# Altium footprint library PcbLib1.PcbLib: 1016 footprints (part 37 of 64)
Each footprint in its own frame and in the unit in brackets; x right, y up, seen from the top. Pads: shape width x height; smd on the part's side, far side on the other; paste and mask are expansions set on the pad; w line width, h text height; cw(c..) or ccw(c..) is an arc to the next point about the centre after c.
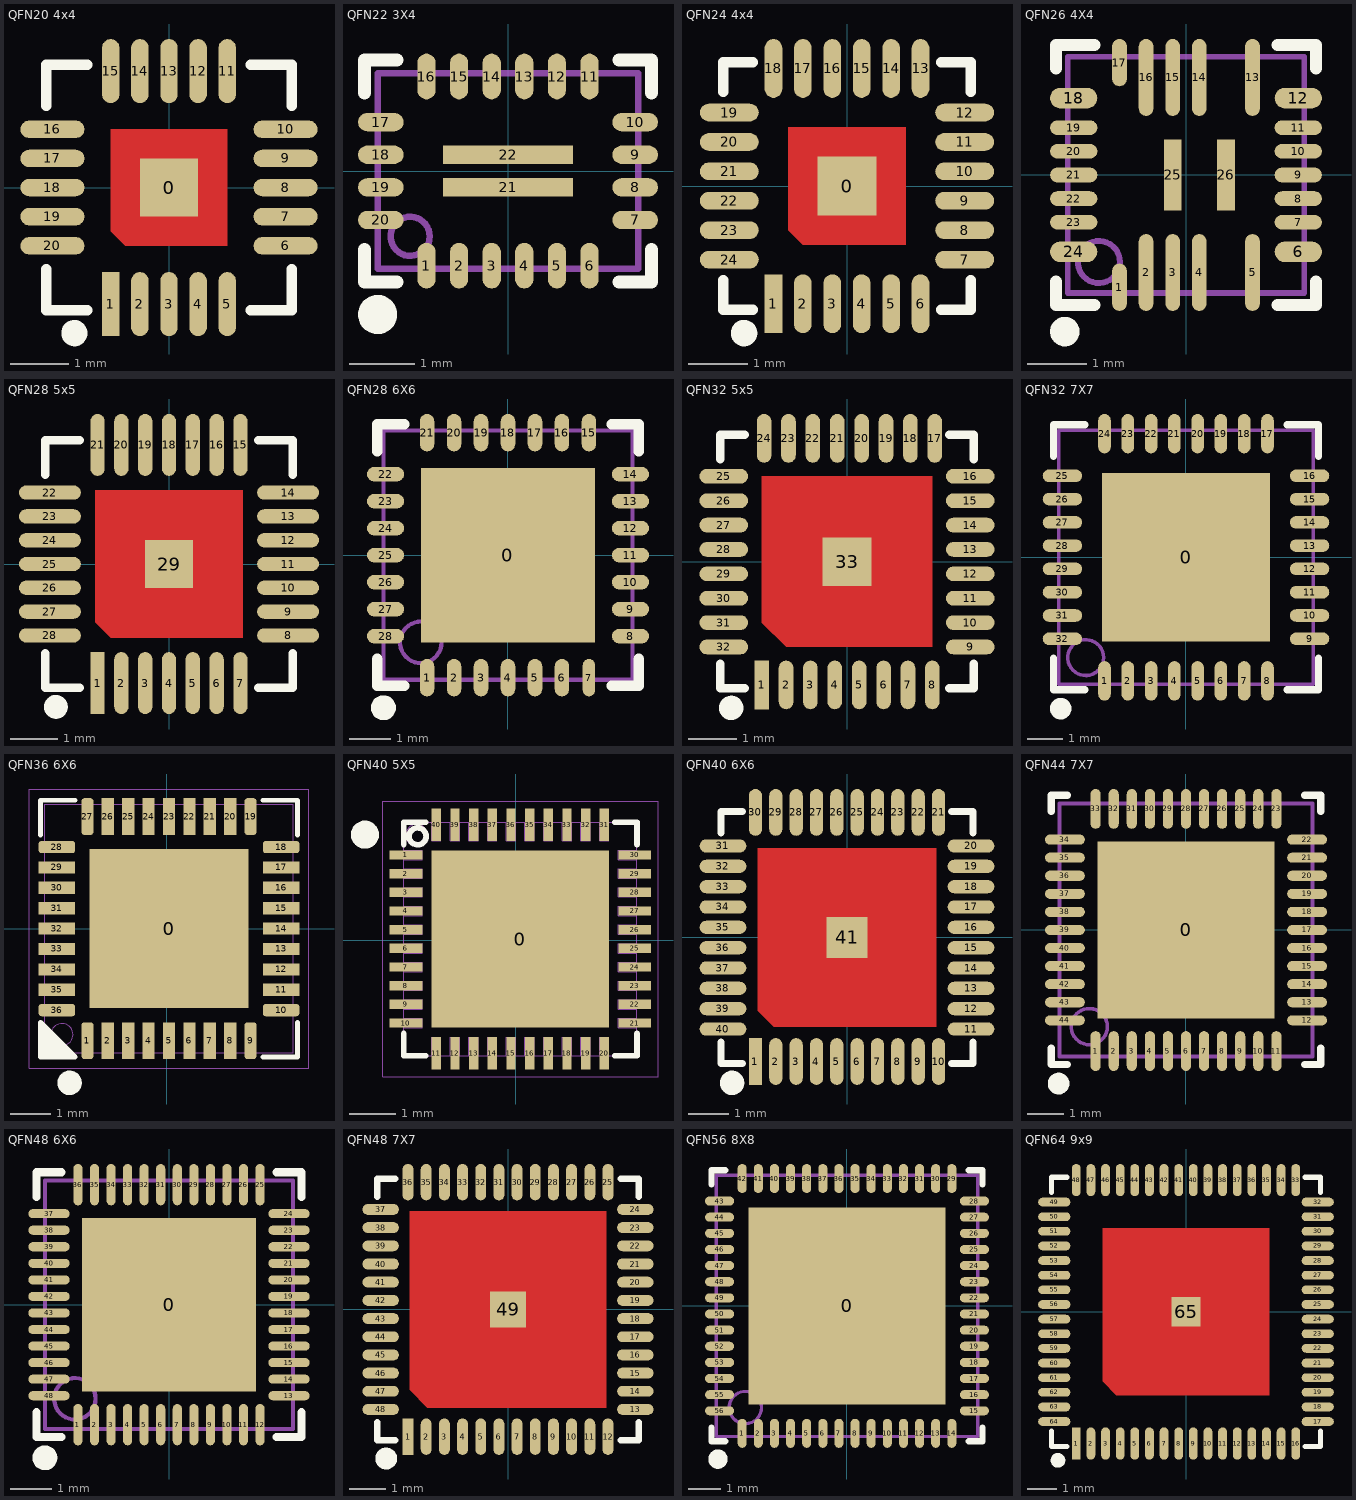
[diagram p36: the footprints below, top view; thin cyan lines are the x and y axes]

## QFN20 4x4 [mm]
pads (21):
  rect 1x1 smd: 0(0,0)
  rect 0.3x1.1 smd: 1(-1,-2)
  oval 0.3x1.1 smd: 2(-0.5,-2) 3(0,-2) 4(0.5,-2) 5(1,-2) 11(1,2) 12(0.5,2) 13(0,2) 14(-0.5,2) 15(-1,2)
  oval 1.1x0.3 smd: 6(2,-1) 7(2,-0.5) 8(2,0) 9(2,0.5) 10(2,1) 16(-2,1) 17(-2,0.5) 18(-2,0) 19(-2,-0.5) 20(-2,-1)
Top Layer:
  region: -1,1 1,1 1,-1 -0.75,-1 -1,-0.75
Top Overlay:
  circle w0.25: c-1.625,-2.5 r0.1
  lines w0.178: -2.106,-1.404 -2.106,-2.106 -1.404,-2.106 ; -2.106,1.404 -2.106,2.106 -1.404,2.106 ; 1.404,-2.106 2.106,-2.106 2.106,-1.404 ; 1.404,2.106 2.106,2.106 2.106,1.404
Mechanical 15:
  circle w0.05: c0,0 r0.35
  lines w0.05: -0.5,0 0.5,0 ; 0,-0.5 0,0.5
3D body "QFN20 4x4.STEP": height 0.98, standoff -0.02, extent -2.01,-2 2.01,2.02

## QFN22 3X4 [mm]
pads (22):
  oval 0.28x0.7 smd mask+0.051: 1(-1.25,-1.45) 2(-0.75,-1.45) 3(-0.25,-1.45) 4(0.25,-1.45) 5(0.75,-1.45) 6(1.25,-1.45) 11(1.25,1.45) 12(0.75,1.45) 13(0.25,1.45) 14(-0.25,1.45) 15(-0.75,1.45) 16(-1.25,1.45)
  oval 0.7x0.28 smd mask+0.051: 7(1.95,-0.75) 8(1.95,-0.25) 9(1.95,0.25) 10(1.95,0.75) 17(-1.95,0.75) 18(-1.95,0.25) 19(-1.95,-0.25) 20(-1.95,-0.75)
  rect 2x0.28 smd mask+0.051: 21(0,-0.25) 22(0,0.25)
Top Overlay:
  circle w0.3: c-2,-2.2 r0.15
  lines w0.2: -2.2,-1.2 -2.2,-1.7 -1.7,-1.7 ; -2.2,1.2 -2.2,1.7 -1.7,1.7 ; 1.7,-1.7 2.2,-1.7 2.2,-1.2 ; 1.7,1.7 2.2,1.7 2.2,1.2
Mechanical 13:
  circle w0.1: c-1.5,-1 r0.3
  lines w0.1: -2,-1.5 2,-1.5 2,1.5 -2,1.5 -2,-1.5

## QFN24 4x4 [mm]
pads (25):
  rect 1x1 smd: 0(0,0)
  rect 0.3x1 smd: 1(-1.25,-2)
  oval 0.3x1 smd: 2(-0.75,-2) 3(-0.25,-2) 4(0.25,-2) 5(0.75,-2) 6(1.25,-2) 13(1.25,2) 14(0.75,2) 15(0.25,2) 16(-0.25,2) 17(-0.75,2) 18(-1.25,2)
  oval 1x0.3 smd: 7(2,-1.25) 8(2,-0.75) 9(2,-0.25) 10(2,0.25) 11(2,0.75) 12(2,1.25) 19(-2,1.25) 20(-2,0.75) 21(-2,0.25) 22(-2,-0.25) 23(-2,-0.75) 24(-2,-1.25)
Top Layer:
  region: -1,1 1,1 1,-1 -0.75,-1 -1,-0.75
Top Overlay:
  circle w0.25: c-1.75,-2.5 r0.1
  lines w0.178: -2.106,-1.6 -2.106,-2.106 -1.6,-2.106 ; -2.106,1.6 -2.106,2.106 -1.6,2.106 ; 1.6,-2.106 2.106,-2.106 2.106,-1.6 ; 1.6,2.106 2.106,2.106 2.106,1.6
Mechanical 15:
  circle w0.05: c0,0 r0.35
  lines w0.05: -0.5,0 0.5,0 ; 0,-0.5 0,0.5
3D body "QFN24 4x4.STEP": height 0.98, standoff -0.02, extent -2.01,-1.984 2.01,2.036

## QFN26 4X4 [mm]
pads (26):
  oval 0.25x0.8 smd mask+0.051: 1(-1.125,-1.9) 17(-1.125,1.9)
  oval 0.25x1.3 smd mask+0.051: 2(-0.675,-1.65) 3(-0.225,-1.65) 4(0.225,-1.65) 5(1.125,-1.65) 13(1.125,1.65) 14(0.225,1.65) 15(-0.225,1.65) 16(-0.675,1.65)
  oval 0.8x0.35 smd mask+0.051: 6(1.9,-1.3) 12(1.9,1.3) 18(-1.9,1.3) 24(-1.9,-1.3)
  oval 0.8x0.25 smd mask+0.051: 7(1.9,-0.8) 8(1.9,-0.4) 9(1.9,0) 10(1.9,0.4) 11(1.9,0.8) 19(-1.9,0.8) 20(-1.9,0.4) 21(-1.9,0) 22(-1.9,-0.4) 23(-1.9,-0.8)
  rect 0.3x1.2 smd mask+0.051: 25(-0.225,0) 26(0.675,0)
Top Overlay:
  circle w0.25: c-2.05,-2.65 r0.125
  lines w0.2: -2.2,-1.8 -2.2,-2.2 -1.55,-2.2 ; -2.2,1.8 -2.2,2.2 -1.55,2.2 ; 1.55,-2.2 2.2,-2.2 2.2,-1.8 ; 1.55,2.2 2.2,2.2 2.2,1.8
Mechanical 13:
  circle w0.1: c-1.473,-1.473 r0.356
  lines w0.1: -2,-2 2,-2 2,2 -2,2 -2,-2

## QFN28 5x5 [mm]
pads (29):
  rect 0.3x1.3 smd: 1(-1.5,-2.5)
  oval 0.3x1.3 smd: 2(-1,-2.5) 3(-0.5,-2.5) 4(0,-2.5) 5(0.5,-2.5) 6(1,-2.5) 7(1.5,-2.5) 15(1.5,2.5) 16(1,2.5) 17(0.5,2.5) 18(0,2.5) 19(-0.5,2.5) 20(-1,2.5) 21(-1.5,2.5)
  oval 1.3x0.3 smd: 8(2.5,-1.5) 9(2.5,-1) 10(2.5,-0.5) 11(2.5,0) 12(2.5,0.5) 13(2.5,1) 14(2.5,1.5) 22(-2.5,1.5) 23(-2.5,1) 24(-2.5,0.5) 25(-2.5,0) 26(-2.5,-0.5) 27(-2.5,-1) 28(-2.5,-1.5)
  rect 1x1 smd: 29(0,0)
Top Layer:
  region: -1.55,1.55 1.55,1.55 1.55,-1.55 -1.225,-1.55 -1.55,-1.225
Top Overlay:
  circle w0.25: c-2.375,-3 r0.125
  lines w0.178: -2.6,-1.875 -2.6,-2.6 -1.875,-2.6 ; -2.6,1.875 -2.6,2.6 -1.875,2.6 ; 1.875,-2.6 2.6,-2.6 2.6,-1.875 ; 1.875,2.6 2.6,2.6 2.6,1.875
Mechanical 15:
  circle w0.05: c0,0 r0.35
  lines w0.05: -0.5,0 0.5,0 ; 0,-0.5 0,0.5
3D body "QFN28 5x5.STEP": height 0.78, standoff -0.02, extent -2.5,-2.51 2.52,2.51

## QFN28 6X6 [mm]
pads (29):
  rect 4.2x4.2 smd mask+0.051: 0(0,0)
  oval 0.35x0.9 smd mask+0.051: 1(-1.95,-2.95) 2(-1.3,-2.95) 3(-0.65,-2.95) 4(0,-2.95) 5(0.65,-2.95) 6(1.3,-2.95) 15(1.95,2.95) 16(1.3,2.95) 17(0.65,2.95) 18(0,2.95) 19(-0.65,2.95) 20(-1.3,2.95) 21(-1.95,2.95)
  oval 0.3x0.9 smd mask+0.051: 7(1.95,-2.95)
  oval 0.9x0.35 smd mask+0.051: 8(2.95,-1.95) 9(2.95,-1.3) 10(2.95,-0.65) 11(2.95,0) 12(2.95,0.65) 13(2.95,1.3) 14(2.95,1.95) 22(-2.95,1.95) 23(-2.95,1.3) 24(-2.95,0.65) 25(-2.95,0) 26(-2.95,-0.65) 27(-2.95,-1.3) 28(-2.95,-1.95)
Top Overlay:
  circle w0.3: c-3,-3.675 r0.15
  lines w0.254: -3.15,-2.5 -3.15,-3.15 -2.5,-3.15 ; -3.15,2.5 -3.15,3.15 -2.5,3.15 ; 2.5,-3.15 3.15,-3.15 3.15,-2.5 ; 2.5,3.15 3.15,3.15 3.15,2.5
Mechanical 13:
  circle w0.1: c-2.1,-2.1 r0.5
  lines w0.1: -3,-3 3,-3 3,3 -3,3 -3,-3

## QFN32 5x5 [mm]
pads (33):
  rect 0.3x1 smd: 1(-1.751,-2.528)
  oval 0.3x1 smd: 2(-1.25,-2.528) 3(-0.75,-2.528) 4(-0.25,-2.528) 5(0.25,-2.528) 6(0.75,-2.528) 7(1.25,-2.528) 8(1.75,-2.528) 17(1.8,2.528) 18(1.3,2.528) 19(0.8,2.528) 20(0.3,2.528) 21(-0.2,2.528) 22(-0.7,2.528) 23(-1.2,2.528) 24(-1.7,2.528)
  oval 1x0.3 smd: 9(2.528,-1.75) 10(2.528,-1.25) 11(2.528,-0.75) 12(2.528,-0.25) 13(2.528,0.25) 14(2.528,0.75) 15(2.528,1.25) 16(2.528,1.75) 25(-2.528,1.75) 26(-2.528,1.25) 27(-2.528,0.75) 28(-2.528,0.25) 29(-2.528,-0.25) 30(-2.528,-0.75) 31(-2.528,-1.25) 32(-2.528,-1.75)
  rect 1x1 smd: 33(0,0)
Top Layer:
  region: -1.75,1.75 1.75,1.75 1.75,-1.75 -1.25,-1.75 -1.75,-1.25
Top Overlay:
  circle w0.25: c-2.375,-3 r0.125
  lines w0.178: -2.6,-2.1 -2.6,-2.6 -2.1,-2.6 ; -2.6,2.1 -2.6,2.6 -2.1,2.6 ; 2.1,-2.6 2.6,-2.6 2.6,-2.1 ; 2.1,2.6 2.6,2.6 2.6,2.1
Mechanical 15:
  circle w0.05: c0,0 r0.35
  lines w0.05: -0.5,0 0.5,0 ; 0,-0.5 0,0.5
3D body "QFN32 5x5.STEP": height 0.93, standoff 0, extent -2.475,-2.526 2.527,2.476

## QFN32 7X7 [mm]
pads (33):
  rect 4.7x4.7 smd paste-2.35 mask+0.051: 0(0,0)
  oval 0.35x1.1 smd mask+0.051: 1(-2.275,-3.45) 2(-1.625,-3.45) 3(-0.975,-3.45) 4(-0.325,-3.45) 5(0.325,-3.45) 6(0.975,-3.45) 7(1.625,-3.45) 8(2.275,-3.45) 17(2.275,3.45) 18(1.625,3.45) 19(0.975,3.45) 20(0.325,3.45) 21(-0.325,3.45) 22(-0.975,3.45) 23(-1.625,3.45) 24(-2.275,3.45)
  oval 1.1x0.35 smd mask+0.051: 9(3.45,-2.275) 10(3.45,-1.625) 11(3.45,-0.975) 12(3.45,-0.325) 13(3.45,0.325) 14(3.45,0.975) 15(3.45,1.625) 16(3.45,2.275) 25(-3.45,2.275) 26(-3.45,1.625) 27(-3.45,0.975) 28(-3.45,0.325) 29(-3.45,-0.325) 30(-3.45,-0.975) 31(-3.45,-1.625) 32(-3.45,-2.275)
Top Overlay:
  circle w0.3: c-3.5,-4.225 r0.15
  lines w0.2: -3.7,-2.815 -3.7,-3.7 -2.815,-3.7 ; -3.7,2.815 -3.7,3.7 -2.815,3.7 ; 2.815,-3.7 3.7,-3.7 3.7,-2.815 ; 2.815,3.7 3.7,3.7 3.7,2.815
Top Paste:
  region: -0.65,0.35 -1.35,0.35 -1.35,-0.35 -0.65,-0.35
  rectangle: -0.35,-0.35 0.35,0.35
  rectangle: -0.35,0.65 0.35,1.35
  region: -0.65,1.35 -1.35,1.35 -1.35,0.65 -0.65,0.65
  rectangle: 0.65,0.65 1.35,1.35
  rectangle: 0.65,-0.35 1.35,0.35
  rectangle: -0.35,-1.35 0.35,-0.65
  rectangle: -1.35,-1.35 -0.65,-0.65
  rectangle: 0.65,-1.35 1.35,-0.65
Mechanical 13:
  circle w0.1: c-2.8,-2.8 r0.5
  lines w0.1: -3.55,-3.55 3.55,-3.55 3.55,3.55 -3.55,3.55 -3.55,-3.55

## QFN36 6X6 [mm]
pads (37):
  rect 3.9x3.9 smd mask+0.05: 0(0.051,0)
  rrect50% 0.3x0.9 smd mask+0.05: 1(-1.949,-2.75) 9(2.051,-2.75) 19(2.051,2.75) 27(-1.949,2.75)
  rect 0.3x0.9 smd mask+0.05: 2(-1.449,-2.75) 3(-0.949,-2.75) 4(-0.449,-2.75) 5(0.051,-2.75) 6(0.551,-2.75) 7(1.051,-2.75) 8(1.551,-2.75) 20(1.551,2.75) 21(1.051,2.75) 22(0.551,2.75) 23(0.051,2.75) 24(-0.449,2.75) 25(-0.949,2.75) 26(-1.449,2.75)
  rrect50% 0.9x0.3 smd mask+0.05: 10(2.801,-2) 18(2.801,2) 28(-2.699,2) 36(-2.699,-2)
  rect 0.9x0.3 smd mask+0.05: 11(2.801,-1.5) 12(2.801,-1) 13(2.801,-0.5) 14(2.801,0) 15(2.801,0.5) 16(2.801,1) 17(2.801,1.5) 29(-2.699,1.5) 30(-2.699,1) 31(-2.699,0.5) 32(-2.699,0) 33(-2.699,-0.5) 34(-2.699,-1) 35(-2.699,-1.5)
Top Overlay:
  circle w0.3: c-2.388,-3.785 r0.15
  lines w0.12: -3.099,-2.9 -2.849,-3.15 ; -3.099,-2.75 -2.699,-3.15 ; -3.099,-2.6 -2.549,-3.15 ; -3.099,-2.45 -2.399,-3.15 ; -3.099,2.3 -3.099,3.15 -2.249,3.15 ; -2.699,-2.75 -3.099,-3.15 ; 2.351,-3.15 3.201,-3.15 3.201,-2.3 ; 2.351,3.15 3.201,3.15 3.201,2.3 ; -3.099,-3.15 -2.249,-3.15 -3.099,-2.3 -3.099,-3.15
Mechanical 14:
  circle w0.01: c-2.574,-2.6 r0.27
  lines w0.01: -2.999,-3.05 -2.999,3.05 3.101,3.05 3.101,-3.05 -2.999,-3.05
Mechanical 16:
  lines w0.01: -3.374,-3.425 3.476,-3.425 3.476,3.425 -3.374,3.425 -3.374,-3.425
3D body "QFN36-EPAD_6X6_P050.STEP": height 0.8, standoff 0, extent -3.009,-3.06 3.111,3.06

## QFN40 5X5 [mm]
pads (41):
  rect 3.8x3.8 smd mask+0.05: 0(0.102,0.025)
  rect 0.7x0.2 smd mask+0.05: 1(-2.348,1.825) 2(-2.348,1.425) 3(-2.348,1.025) 4(-2.348,0.625) 5(-2.348,0.225) 6(-2.348,-0.175) 7(-2.348,-0.575) 8(-2.348,-0.975) 9(-2.348,-1.375) 10(-2.348,-1.775) 21(2.552,-1.775) 22(2.552,-1.375) 23(2.552,-0.975) 24(2.552,-0.575) 25(2.552,-0.175) 26(2.552,0.225) 27(2.552,0.625) 28(2.552,1.025) 29(2.552,1.425) 30(2.552,1.825)
  rect 0.2x0.7 smd mask+0.05: 11(-1.698,-2.425) 12(-1.298,-2.425) 13(-0.898,-2.425) 14(-0.498,-2.425) 15(-0.098,-2.425) 16(0.302,-2.425) 17(0.702,-2.425) 18(1.102,-2.425) 19(1.502,-2.425) 20(1.902,-2.425) 31(1.902,2.475) 32(1.502,2.475) 33(1.102,2.475) 34(0.702,2.475) 35(0.302,2.475) 36(-0.098,2.475) 37(-0.498,2.475) 38(-0.898,2.475) 39(-1.298,2.475) 40(-1.698,2.475)
Top Overlay:
  circle w0.12: c-2.098,2.225 r0.182
  circle w0.3: c-3.226,2.261 r0.15
  lines w0.12: -2.398,-2 -2.398,-2.475 -1.923,-2.475 ; -2.398,2.05 -2.398,2.525 -1.923,2.525 ; 2.127,-2.475 2.602,-2.475 2.602,-2 ; 2.127,2.525 2.602,2.525 2.602,2.05
Mechanical 14:
  circle w0.01: c-2.123,2.25 r0.23
  lines w0.01: -2.398,-1.875 -1.998,-1.875 -1.998,-1.675 -2.398,-1.675 ; -2.398,-1.475 -1.998,-1.475 -1.998,-1.275 -2.398,-1.275 ; -2.398,-1.075 -1.998,-1.075 -1.998,-0.875 -2.398,-0.875 ; -2.398,-0.675 -1.998,-0.675 -1.998,-0.475 -2.398,-0.475 ; -2.398,-0.275 -1.998,-0.275 -1.998,-0.075 -2.398,-0.075 ; -2.398,0.125 -1.998,0.125 -1.998,0.325 -2.398,0.325 ; -2.398,0.525 -1.998,0.525 -1.998,0.725 -2.398,0.725 ; -2.398,0.925 -1.998,0.925 -1.998,1.125 -2.398,1.125 ; -2.398,1.325 -1.998,1.325 -1.998,1.525 -2.398,1.525 ; -2.398,1.725 -1.998,1.725 -1.998,1.925 -2.398,1.925 ; -1.798,-2.475 -1.798,-2.075 -1.598,-2.075 -1.598,-2.475 ; -1.798,2.525 -1.798,2.125 -1.598,2.125 -1.598,2.525 ; -1.398,-2.475 -1.398,-2.075 -1.198,-2.075 -1.198,-2.475 ; -1.398,2.525 -1.398,2.125 -1.198,2.125 -1.198,2.525 ; -0.998,-2.475 -0.998,-2.075 -0.798,-2.075 -0.798,-2.475 ; -0.998,2.525 -0.998,2.125 -0.798,2.125 -0.798,2.525 ; -0.598,-2.475 -0.598,-2.075 -0.398,-2.075 -0.398,-2.475 ; -0.598,2.525 -0.598,2.125 -0.398,2.125 -0.398,2.525 ; -0.198,-2.475 -0.198,-2.075 0.002,-2.075 0.002,-2.475 ; -0.198,2.525 -0.198,2.125 0.002,2.125 0.002,2.525 ; 0.202,-2.475 0.202,-2.075 0.402,-2.075 0.402,-2.475 ; 0.202,2.525 0.202,2.125 0.402,2.125 0.402,2.525 ; 0.602,-2.475 0.602,-2.075 0.802,-2.075 0.802,-2.475 ; 0.602,2.525 0.602,2.125 0.802,2.125 0.802,2.525 ; 1.002,-2.475 1.002,-2.075 1.202,-2.075 1.202,-2.475 ; 1.002,2.525 1.002,2.125 1.202,2.125 1.202,2.525 ; 1.402,-2.475 1.402,-2.075 1.602,-2.075 1.602,-2.475 ; 1.402,2.525 1.402,2.125 1.602,2.125 1.602,2.525 ; 1.802,-2.475 1.802,-2.075 2.002,-2.075 2.002,-2.475 ; 1.802,2.525 1.802,2.125 2.002,2.125 2.002,2.525 ; 2.602,-1.875 2.202,-1.875 2.202,-1.675 2.602,-1.675 ; 2.602,-1.475 2.202,-1.475 2.202,-1.275 2.602,-1.275 ; 2.602,-1.075 2.202,-1.075 2.202,-0.875 2.602,-0.875 ; 2.602,-0.675 2.202,-0.675 2.202,-0.475 2.602,-0.475 ; 2.602,-0.275 2.202,-0.275 2.202,-0.075 2.602,-0.075 ; 2.602,0.125 2.202,0.125 2.202,0.325 2.602,0.325 ; 2.602,0.525 2.202,0.525 2.202,0.725 2.602,0.725 ; 2.602,0.925 2.202,0.925 2.202,1.125 2.602,1.125 ; 2.602,1.325 2.202,1.325 2.202,1.525 2.602,1.525 ; 2.602,1.725 2.202,1.725 2.202,1.925 2.602,1.925 ; -2.398,-2.475 -2.398,2.525 2.602,2.525 2.602,-2.475 -2.398,-2.475 ; -1.748,-1.825 1.952,-1.825 1.952,1.875 -1.748,1.875 -1.748,-1.825
  text "1" at -2.248,1.675 h0.5
  text "10" at -2.348,-1.925 h0.5
  text "11" at -1.873,-2.425 h0.5
  text "20" at 1.677,-2.425 h0.5
  text "21" at 2.152,-1.925 h0.5
  text "30" at 2.102,1.675 h0.5
  text "31" at 1.702,2.15 h0.5
  text "40" at -1.848,2.15 h0.5
Mechanical 16:
  lines w0.01: -2.848,-2.925 3.052,-2.925 3.052,2.975 -1.848,2.975 -2.848,2.975 -2.848,-2.925
3D body "QFN40-5X5-P040.STEP": height 0.73, standoff -0.02, extent -2.399,-2.476 2.603,2.526
3D body: height 0.73, standoff 0.73, extent -2.398,-2.475 2.602,2.525
3D body: height 0.74, standoff 0.73, extent -2.146,1.576 -1.648,2.075

## QFN40 6X6 [mm]
pads (41):
  rect 0.325x1.15 smd mask+0.051: 1(-2.25,-3.051)
  oval 0.325x1.15 smd mask+0.051: 2(-1.75,-3.051) 3(-1.25,-3.051) 4(-0.75,-3.051) 5(-0.25,-3.051) 6(0.25,-3.051) 7(0.75,-3.051) 8(1.25,-3.051) 9(1.75,-3.051) 10(2.25,-3.051) 21(2.25,3.076) 22(1.75,3.076) 23(1.25,3.076) 24(0.75,3.076) 25(0.25,3.076) 26(-0.25,3.076) 27(-0.75,3.076) 28(-1.25,3.076) 29(-1.75,3.076) 30(-2.25,3.076)
  oval 1.15x0.325 smd mask+0.051: 11(3.051,-2.25) 12(3.051,-1.75) 13(3.051,-1.25) 14(3.051,-0.75) 15(3.051,-0.25) 16(3.051,0.25) 17(3.051,0.75) 18(3.051,1.25) 19(3.051,1.75) 20(3.051,2.25) 31(-3.051,2.25) 32(-3.051,1.75) 33(-3.051,1.25) 34(-3.051,0.75) 35(-3.051,0.25) 36(-3.051,-0.25) 37(-3.051,-0.75) 38(-3.051,-1.25) 39(-3.051,-1.75) 40(-3.051,-2.25)
  rect 1x1 smd mask+0.051: 41(0,0)
Top Layer:
  region: -2.2,2.2 2.2,2.2 2.2,-2.2 -1.8,-2.2 -2.2,-1.8
Top Overlay:
  circle w0.3: c-2.825,-3.575 r0.15
  lines w0.178: -3.1,-2.575 -3.1,-3.1 -2.575,-3.1 ; -3.1,2.575 -3.1,3.1 -2.575,3.1 ; 2.575,-3.1 3.1,-3.1 3.1,-2.575 ; 2.575,3.1 3.1,3.1 3.1,2.575
Mechanical 15:
  circle w0.05: c0,0 r0.35
  lines w0.05: -0.5,0 0.5,0 ; 0,-0.5 0,0.5
3D body "QFN40 6X6.STEP": height 0.95, standoff -0.01, extent -2.997,-3.01 3.023,3.01

## QFN44 7X7 [mm]
pads (45):
  rect 4.9x4.9 smd mask+0.051: 0(0,0)
  oval 0.28x1.1 smd mask+0.051: 1(-2.5,-3.35) 2(-2,-3.35) 3(-1.5,-3.35) 4(-1,-3.35) 5(-0.5,-3.35) 6(0,-3.35) 7(0.5,-3.35) 8(1,-3.35) 9(1.5,-3.35) 10(2,-3.35) 11(2.5,-3.35) 23(2.5,3.35) 24(2,3.35) 25(1.5,3.35) 26(1,3.35) 27(0.5,3.35) 28(0,3.35) 29(-0.5,3.35) 30(-1,3.35) 31(-1.5,3.35) 32(-2,3.35) 33(-2.5,3.35)
  oval 1.1x0.28 smd mask+0.051: 12(3.35,-2.5) 13(3.35,-2) 14(3.35,-1.5) 15(3.35,-1) 16(3.35,-0.5) 17(3.35,0) 18(3.35,0.5) 19(3.35,1) 20(3.35,1.5) 21(3.35,2) 22(3.35,2.5) 34(-3.35,2.5) 35(-3.35,2) 36(-3.35,1.5) 37(-3.35,1) 38(-3.35,0.5) 39(-3.35,0) 40(-3.35,-0.5) 41(-3.35,-1) 42(-3.35,-1.5) 43(-3.35,-2) 44(-3.35,-2.5)
Top Overlay:
  circle w0.3: c-3.525,-4.25 r0.15
  lines w0.2: -3.725,-3.275 -3.725,-3.725 -3.275,-3.725 ; -3.725,3.275 -3.725,3.725 -3.275,3.725 ; 3.275,-3.725 3.725,-3.725 3.725,-3.275 ; 3.275,3.725 3.725,3.725 3.725,3.275
Mechanical 13:
  circle w0.1: c-2.675,-2.675 r0.5
  lines w0.1: -3.5,-3.5 3.5,-3.5 3.5,3.5 -3.5,3.5 -3.5,-3.5

## QFN48 6X6 [mm]
pads (49):
  rect 4.2x4.2 smd mask+0.051: 0(0,0)
  oval 0.22x1 smd mask+0.051: 1(-2.2,-2.9) 2(-1.8,-2.9) 3(-1.4,-2.9) 4(-1,-2.9) 5(-0.6,-2.9) 6(-0.2,-2.9) 7(0.2,-2.9) 8(0.6,-2.9) 9(1,-2.9) 10(1.4,-2.9) 11(1.8,-2.9) 12(2.2,-2.9) 25(2.2,2.9) 26(1.8,2.9) 27(1.4,2.9) 28(1,2.9) 29(0.6,2.9) 30(0.2,2.9) 31(-0.2,2.9) 32(-0.6,2.9) 33(-1,2.9) 34(-1.4,2.9) 35(-1.8,2.9) 36(-2.2,2.9)
  oval 1x0.22 smd mask+0.051: 13(2.9,-2.2) 14(2.9,-1.8) 15(2.9,-1.4) 16(2.9,-1) 17(2.9,-0.6) 18(2.9,-0.2) 19(2.9,0.2) 20(2.9,0.6) 21(2.9,1) 22(2.9,1.4) 23(2.9,1.8) 24(2.9,2.2) 37(-2.9,2.2) 38(-2.9,1.8) 39(-2.9,1.4) 40(-2.9,1) 41(-2.9,0.6) 42(-2.9,0.2) 43(-2.9,-0.2) 44(-2.9,-0.6) 45(-2.9,-1) 46(-2.9,-1.4) 47(-2.9,-1.8) 48(-2.9,-2.2)
Top Overlay:
  circle w0.3: c-3,-3.7 r0.15
  lines w0.2: -3.2,-2.6 -3.2,-3.2 -2.6,-3.2 ; -3.2,2.6 -3.2,3.2 -2.6,3.2 ; 2.6,-3.2 3.2,-3.2 3.2,-2.6 ; 2.6,3.2 3.2,3.2 3.2,2.6
Mechanical 13:
  circle w0.1: c-2.275,-2.275 r0.5
  lines w0.1: -3,-3 3,-3 3,3 -3,3 -3,-3

## QFN48 7X7 [mm]
pads (49):
  rect 0.3x1 smd: 1(-2.75,-3.5)
  oval 0.3x1 smd: 2(-2.25,-3.5) 3(-1.75,-3.5) 4(-1.25,-3.5) 5(-0.75,-3.5) 6(-0.25,-3.5) 7(0.25,-3.5) 8(0.75,-3.5) 9(1.25,-3.5) 10(1.75,-3.5) 11(2.25,-3.5) 12(2.75,-3.5) 25(2.75,3.5) 26(2.25,3.5) 27(1.75,3.5) 28(1.25,3.5) 29(0.75,3.5) 30(0.25,3.5) 31(-0.25,3.5) 32(-0.75,3.5) 33(-1.25,3.5) 34(-1.75,3.5) 35(-2.25,3.5) 36(-2.75,3.5)
  oval 1x0.3 smd: 13(3.5,-2.75) 14(3.5,-2.25) 15(3.5,-1.75) 16(3.5,-1.25) 17(3.5,-0.75) 18(3.5,-0.25) 19(3.5,0.25) 20(3.5,0.75) 21(3.5,1.25) 22(3.5,1.75) 23(3.5,2.25) 24(3.5,2.75) 37(-3.5,2.75) 38(-3.5,2.25) 39(-3.5,1.75) 40(-3.5,1.25) 41(-3.5,0.75) 42(-3.5,0.25) 43(-3.5,-0.25) 44(-3.5,-0.75) 45(-3.5,-1.25) 46(-3.5,-1.75) 47(-3.5,-2.25) 48(-3.5,-2.75)
  rect 1x1 smd mask+0.051: 49(0,0)
Top Layer:
  region: -2.7,2.7 2.7,2.7 2.7,-2.7 -2.214,-2.7 -2.7,-2.214
Top Overlay:
  circle w0.3: c-3.35,-4.1 r0.15
  lines w0.178: -3.6,-3.1 -3.6,-3.6 -3.1,-3.6 ; -3.6,3.1 -3.6,3.6 -3.1,3.6 ; 3.1,-3.6 3.6,-3.6 3.6,-3.1 ; 3.1,3.6 3.6,3.6 3.6,3.1
Mechanical 15:
  circle w0.05: c0,0 r0.35
  lines w0.05: -0.5,0 0.5,0 ; 0,-0.5 0,0.5
3D body "QFN48 7X7.STEP": height 0.98, standoff -0.02, extent -3.535,-3.531 3.485,3.489

## QFN56 8X8 [mm]
pads (57):
  rect 6.1x6.1 smd mask+0.051: 0(0,0)
  oval 0.28x0.9 smd mask+0.051: 1(-3.25,-3.95) 2(-2.75,-3.95) 3(-2.25,-3.95) 4(-1.75,-3.95) 5(-1.25,-3.95) 6(-0.75,-3.95) 7(-0.25,-3.95) 8(0.25,-3.95) 9(0.75,-3.95) 10(1.25,-3.95) 11(1.75,-3.95) 12(2.25,-3.95) 13(2.75,-3.95) 14(3.25,-3.95) 29(3.25,3.95) 30(2.75,3.95) 31(2.25,3.95) 32(1.75,3.95) 33(1.25,3.95) 34(0.75,3.95) 35(0.25,3.95) 36(-0.25,3.95) 37(-0.75,3.95) 38(-1.25,3.95) 39(-1.75,3.95) 40(-2.25,3.95) 41(-2.75,3.95) 42(-3.25,3.95)
  oval 0.9x0.28 smd mask+0.051: 15(3.95,-3.25) 16(3.95,-2.75) 17(3.95,-2.25) 18(3.95,-1.75) 19(3.95,-1.25) 20(3.95,-0.75) 21(3.95,-0.25) 22(3.95,0.25) 23(3.95,0.75) 24(3.95,1.25) 25(3.95,1.75) 26(3.95,2.25) 27(3.95,2.75) 28(3.95,3.25) 43(-3.95,3.25) 44(-3.95,2.75) 45(-3.95,2.25) 46(-3.95,1.75) 47(-3.95,1.25) 48(-3.95,0.75) 49(-3.95,0.25) 50(-3.95,-0.25) 51(-3.95,-0.75) 52(-3.95,-1.25) 53(-3.95,-1.75) 54(-3.95,-2.25) 55(-3.95,-2.75) 56(-3.95,-3.25)
Top Overlay:
  circle w0.3: c-4,-4.75 r0.15
  lines w0.2: -4.2,-3.775 -4.2,-4.2 -3.775,-4.2 ; -4.2,3.775 -4.2,4.2 -3.775,4.2 ; 3.775,-4.2 4.2,-4.2 4.2,-3.775 ; 3.775,4.2 4.2,4.2 4.2,3.775
Mechanical 13:
  circle w0.1: c-3.15,-3.15 r0.5
  lines w0.1: -4.05,-4.05 4.05,-4.05 4.05,4.05 -4.05,4.05 -4.05,-4.05

## QFN64 9x9 [mm]
pads (65):
  rect 0.3x1.1 smd: 1(-3.75,-4.5)
  oval 0.3x1.1 smd: 2(-3.25,-4.5) 3(-2.75,-4.5) 4(-2.25,-4.5) 5(-1.75,-4.5) 6(-1.25,-4.5) 7(-0.75,-4.5) 8(-0.25,-4.5) 9(0.25,-4.5) 10(0.75,-4.5) 11(1.25,-4.5) 12(1.75,-4.5) 13(2.25,-4.5) 14(2.75,-4.5) 15(3.25,-4.5) 16(3.75,-4.5) 33(3.75,4.5) 34(3.25,4.5) 35(2.75,4.5) 36(2.25,4.5) 37(1.75,4.5) 38(1.25,4.5) 39(0.75,4.5) 40(0.25,4.5) 41(-0.25,4.5) 42(-0.75,4.5) 43(-1.25,4.5) 44(-1.75,4.5) 45(-2.25,4.5) 46(-2.75,4.5) 47(-3.25,4.5) 48(-3.75,4.5)
  oval 1.1x0.3 smd: 17(4.5,-3.75) 18(4.5,-3.25) 19(4.5,-2.75) 20(4.5,-2.25) 21(4.5,-1.75) 22(4.5,-1.25) 23(4.5,-0.75) 24(4.5,-0.25) 25(4.5,0.25) 26(4.5,0.75) 27(4.5,1.25) 28(4.5,1.75) 29(4.5,2.25) 30(4.5,2.75) 31(4.5,3.25) 32(4.5,3.75) 49(-4.5,3.75) 50(-4.5,3.25) 51(-4.5,2.75) 52(-4.5,2.25) 53(-4.5,1.75) 54(-4.5,1.25) 55(-4.5,0.75) 56(-4.5,0.25) 57(-4.5,-0.25) 58(-4.5,-0.75) 59(-4.5,-1.25) 60(-4.5,-1.75) 61(-4.5,-2.25) 62(-4.5,-2.75) 63(-4.5,-3.25) 64(-4.5,-3.75)
  rect 1x1 smd: 65(0,0)
Top Layer:
  region: -2.85,2.85 2.85,2.85 2.85,-2.85 -2.375,-2.85 -2.85,-2.375
Top Overlay:
  circle w0.25: c-4.375,-5.075 r0.125
  lines w0.178: -4.6,-4.075 -4.6,-4.6 -4.075,-4.6 ; -4.6,4.075 -4.6,4.6 -4.075,4.6 ; 4.075,-4.6 4.6,-4.6 4.6,-4.075 ; 4.075,4.6 4.6,4.6 4.6,4.075
Mechanical 15:
  circle w0.05: c0,0 r0.35
  lines w0.05: -0.5,0 0.5,0 ; 0,-0.5 0,0.5
3D body "QFN64 9x9.STEP": height 0.98, standoff -0.02, extent -4.521,-4.499 4.499,4.521